# Altium footprint library VNGS01 V1.31.PcbLib: 36 footprints (part 2 of 3)
Each footprint in its own frame and in the unit in brackets; x right, y up, seen from the top. Pads: shape width x height; smd on the part's side, far side on the other; paste and mask are expansions set on the pad; w line width, h text height; cw(c..) or ccw(c..) is an arc to the next point about the centre after c.
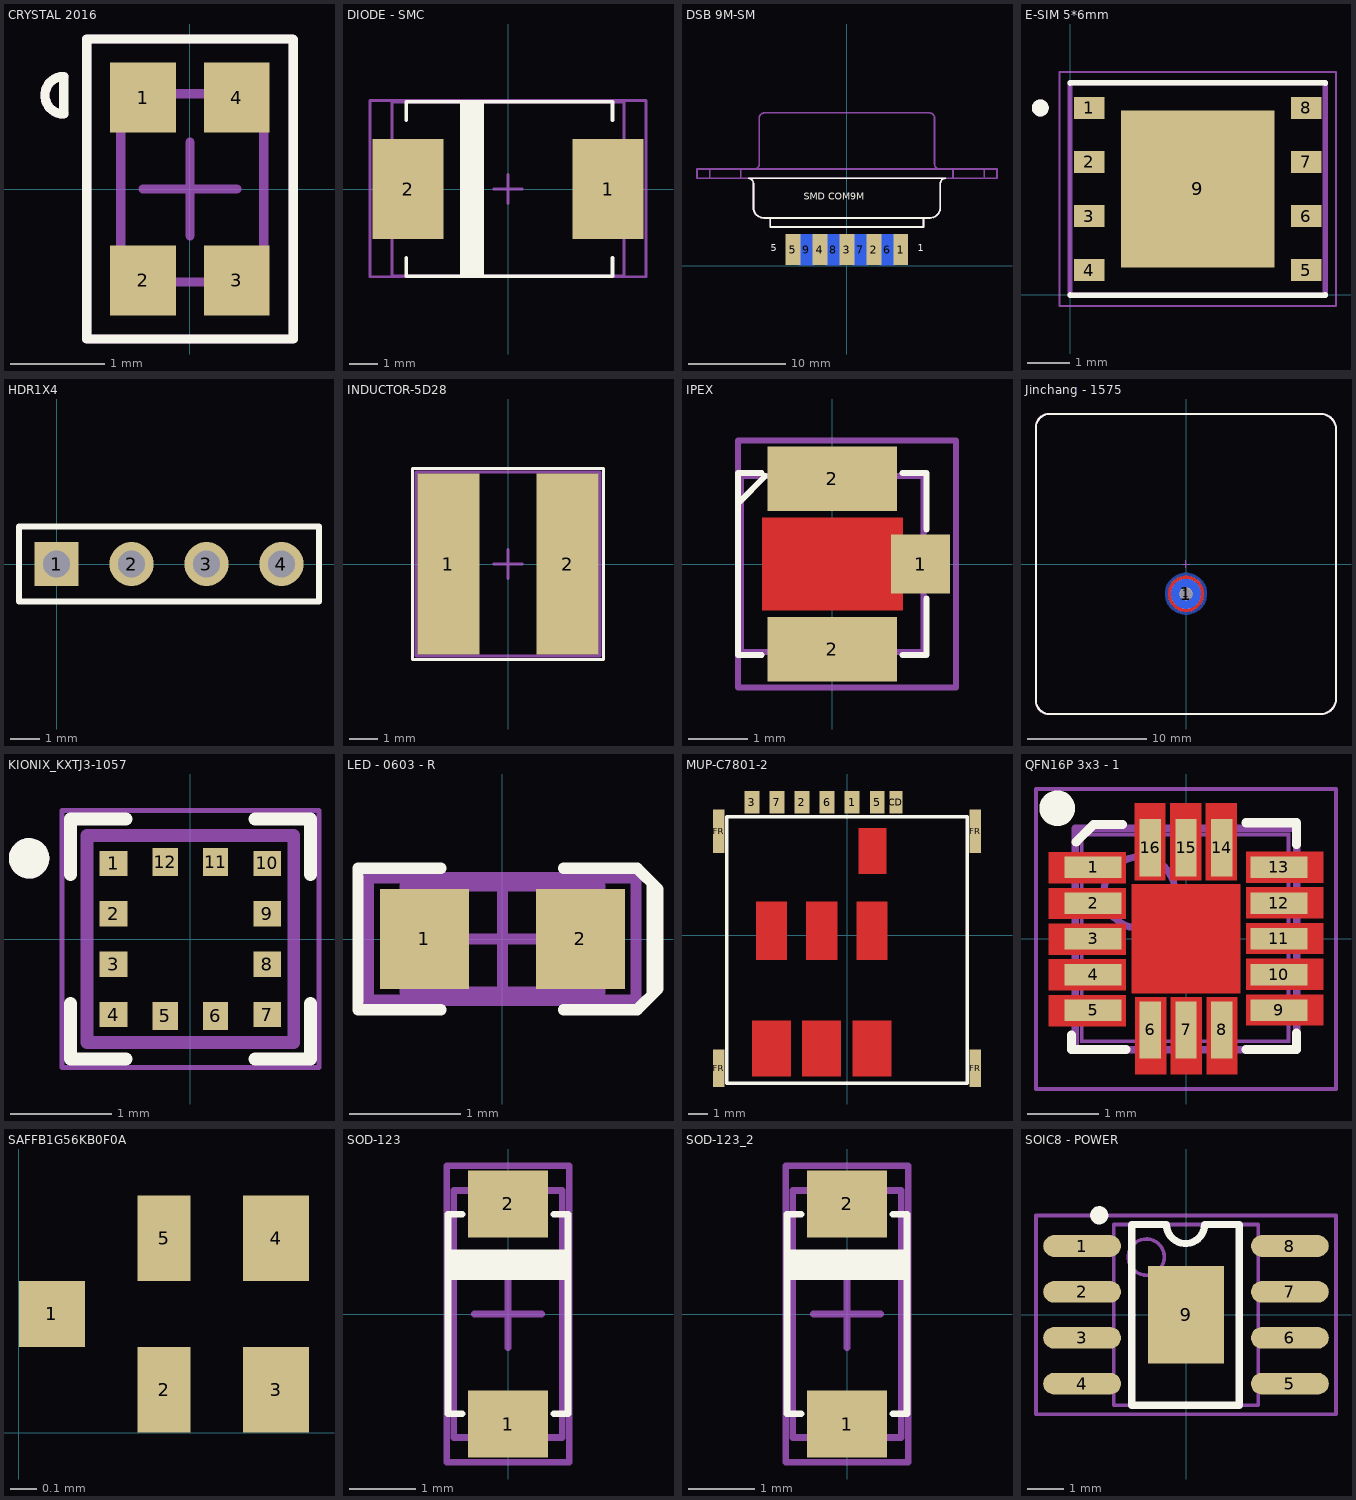
[diagram p1: the footprints below, top view; thin cyan lines are the x and y axes]

## CRYSTAL 2016 [mm] "Surface Mount,4-SMD, No Lead (DFN, LCC),2.00mm x 1.60mm"
height 0.7
pads (4):
  rect 0.7x0.75 smd mask+0.119: 1(-0.5,0.975) 2(-0.5,-0.975) 3(0.5,-0.975) 4(0.5,0.975)
Top Overlay:
  lines w0.1: -1.346,0.799 cw(c-1.346,0.999) -1.346,1.199 -1.346,0.799 ; -1.099,-1.599 1.099,-1.599 1.099,1.593 1.094,1.599 -1.099,1.599 -1.099,-1.599
Mechanical 1:
  lines w0.1: -1.346,0.799 cw(c-1.346,0.999) -1.346,1.199
Mechanical 13:
  lines w0.1: -0.737,-0.991 0.787,-0.991 0.787,1.016 -0.737,1.016 -0.737,-0.991
Mechanical 15:
  lines w0.1: -0.5,0 0.5,0 ; 0,-0.5 0,0.5 ; -1.099,-1.599 -1.099,1.599 1.094,1.599 1.099,1.593 1.099,-1.599 -1.099,-1.599
3D body "User Library-NT2016SA-END4910A-48MHZ Crystal (NDK).STEP": height 0.7, standoff 0, extent -0.771,-0.985 0.829,1.015

## DIODE - SMC [mm] "Diode; 2 Leads, 6.8x5.9mm"
pads (2):
  rect 2.5x3.5 smd: 1(3.5,0) 2(-3.5,0)
Top Overlay:
  rectangle: -1.676,-3.099 -0.838,3.048
  lines w0.127: -3.556,-2.413 -3.556,-3.048 3.658,-3.048 3.658,-2.413 ; -3.556,2.413 -3.556,3.048 3.658,3.048 3.658,2.413 ; -1.397,-3.048 -1.397,3.048
Mechanical 13:
  lines w0.1: -4.064,-3.048 -4.064,3.048 4.064,3.048 4.064,-3.048 -4.064,-3.048
Mechanical 15:
  lines w0.1: -0.5,0 0.5,0 ; 0,-0.5 0,0.5 ; -4.826,-3.073 -4.826,3.099 -4.724,3.099 4.826,3.099 4.826,-3.073 -4.826,-3.073
3D body "Diode - SMC.STEP": height 2.4, standoff 0.03, extent -4.065,-3.05 4.065,3.05

## DSB 9M-SM [mil] "Com 9 chan SMD,F"
height 296.46
pads (9):
  rect 60x125.98 smd: 1(218.11,66) 2(109.06,66) 3(0,66) 4(-109.06,66) 5(-218.11,66)
  rect 60x125.98 smd far side: 6(163.58,66) 7(54.53,66) 8(-54.53,66) 9(-163.58,66)
Top Overlay:
  lines w7: -377.95,236 -377.95,332.93 ; 377.95,236.95 377.95,334
  lines w7.01: -398.93,354.98 cw(c-399.46,333.46) -377.95,332.93 ; -395,354.98 400,354.98 ccw(c399.46,333.46) 377.95,334 ; -377.95,236 ccw(c-335.45,236.45) -335,193.95 335.95,193.95 ; -310,193.95 -310,157.73 310,157.73 ; 310,158 310,193 ; 335.95,194 ccw(c335.5,236.5) 378,236.95
  text "1" at 287,50 h47.24
  text "5" at -308,50 h47.24
  text "SMD COM9M" at -174.02,257.86 h47.24
Mechanical 13:
  lines w7: -377.95,236 -377.95,332.93 ; -333.07,619 333.07,619 ; 377.95,236.95 377.95,334
  lines w7.01: -554.92,354.98 -554.92,391.98 ; -428.94,357 -428.94,388 ; -398.93,354.98 cw(c-399.46,333.46) -377.95,332.93 ; -377.95,236 ccw(c-335.45,236.45) -335,193.95 335.95,193.95 ; -373.35,391.98 ccw(c-374.18,411.82) -354.35,412.65 -354.33,598.07 cw(c-333.24,597.91) -333.07,619 ; -310,193.95 -310,157.73 310,157.73 ; 310,158 310,193 ; 333.07,619 cw(c333.24,597.91) 354.33,598.07 354.33,411 ccw(c374.17,411.83) 375,392 ; 335.95,194 ccw(c335.5,236.5) 378,236.95 ; 377.95,334 cw(c399.46,333.46) 400,354.98 ; 428.94,358 428.94,389 ; 554.92,360 554.92,391 ; -606,355 -606,392 607,391.98 607,354.98 -325,354.98 -606,354.98
  text "SMD COM9M" at -174.02,257.86 h47.24
3D body "DB9 Straight.STEP": height 220.41, standoff -275.59, extent -606,20 607,619

## E-SIM 5*6mm [mm]
pads (9):
  rect 0.71x0.51 smd: 1(0.447,4.394) 2(0.447,3.124) 3(0.447,1.854) 4(0.447,0.584) 5(5.547,0.584) 6(5.547,1.854) 7(5.547,3.124) 8(5.547,4.394)
  rect 3.6x3.7 smd paste-3: 9(2.997,2.489)
Top Overlay:
  circle w0.2: c-0.703,4.394 r0.1
  lines w0.127: -0.003,0.009 -0.003,-0.011 5.997,-0.011 5.997,0.009 ; -0.003,4.969 -0.003,4.989 5.997,4.989 5.997,4.969
Top Paste:
  region: 4.352,1.084 3.222,1.084 3.222,2.264 4.352,2.264
  region: 2.772,2.714 1.642,2.714 1.642,3.894 2.772,3.894
  region: 2.772,1.084 1.642,1.084 1.642,2.264 2.772,2.264
  region: 4.352,2.714 3.222,2.714 3.222,3.894 4.352,3.894
Top Courtyard:
  lines w0.05: -0.253,-0.261 6.247,-0.261 6.247,5.239 -0.253,5.239 -0.253,-0.261
Top 3D Body:
  circle w0.2: c-0.703,4.394 r0.1
  lines w0.127: -0.003,-0.011 5.997,-0.011 5.997,4.989 -0.003,4.989 -0.003,-0.011
3D body "step_temp.STEP": height 0.82, standoff 0, extent -0.003,-0.011 5.997,4.989

## HDR1X4 [mm] "Connector; Header; 4 Position"
height 2.54
pads (4):
  rect 1.5x1.5 hole 0.9: 1(0,0)
  round 1.5 hole 0.9: 2(2.54,0) 3(5.08,0) 4(7.62,0)
Top Overlay:
  lines w0.2: -1.27,-1.27 -1.27,1.27 8.89,1.27 8.89,-1.27 -1.27,-1.27
3D body: height 7, standoff -1, extent 7.214,-0.406 8.011,0.392
3D body: height 1.5, standoff 0, extent 6.35,-1.27 8.89,1.27
3D body: height 1.5, standoff 0, extent -1.27,-1.27 1.27,1.27
3D body: height 1.5, standoff 0, extent 3.81,-1.27 6.35,1.27
3D body: height 1.5, standoff 0, extent 1.27,-1.27 3.81,1.27
3D body: height 7, standoff -1, extent -0.406,-0.406 0.39,0.392
3D body: height 7, standoff -1, extent 4.674,-0.406 5.47,0.392
3D body: height 7, standoff -1, extent 2.134,-0.406 2.93,0.392

## INDUCTOR-5D28 [mm] "Shielded Inductor 6x6mm"
pads (2):
  rect 2.15x6.3 smd: 1(-2.075,0) 2(2.075,0)
Top Overlay:
  lines w0.1: -3.327,-3.327 -3.327,3.327 -3.302,3.327 3.327,3.327 3.327,-3.327 -3.302,-3.327 -3.327,-3.327
Mechanical 13:
  lines w0.1: -3.2,-3.2 3.2,-3.2 3.2,3.2 -3.2,3.2 -3.2,-3.2
Mechanical 15:
  lines w0.1: -0.5,0 0.5,0 ; 0,-0.5 0,0.5 ; -3.327,-3.327 3.327,-3.327 3.327,3.327 -3.327,3.327 -3.327,-3.327
3D body "INDUCTOR 5D28.STEP": height 3, standoff 0, extent -3.104,-3 2.896,3

## IPEX [mm] "Connector SMA, 3mmx3.1mm, high 1.25mm."
height 7.53
pads (3):
  rect 1x1 smd: 1(1.5,0)
  rect 2.2x1.1 smd: 2(0,-1.45) 2(0,1.45)
Top Layer:
  pour cut-out: -1.194,0.787 -1.194,-0.787 1.194,-0.787 1.194,0.787
Top Overlay:
  lines w0.1: -1.599,1.035 -1.136,1.498 ; -1.2,-1.55 -1.6,-1.55 -1.6,1.55 -1.2,1.55 ; 1.194,-1.55 1.6,-1.55 1.6,-0.584 ; 1.194,1.55 1.6,1.55 1.6,0.584
Mechanical 13:
  lines w0.1: -1.549,-1.499 1.549,-1.499 1.549,1.499 -1.549,1.499 -1.549,-1.499
Mechanical 15:
  lines w0.1: -0.3,0 0.3,0 ; 0,-0.3 0,0.3 ; -1.6,-2.1 -1.6,2.1 2.1,2.1 2.1,-2.1 -1.6,-2.1
3D body "User Library-20279-001.STEP": height 1.25, standoff -0.01, extent -1.55,-1.5 1.55,1.5

## Jinchang - 1575 [mm] "Anten GPS, 25x25x4mm"
height 4
pads (2):
  round 1.1 hole 1: 1(0,-2.5)
  round 2.5 smd far side: 1(0,-2.5)
Top Layer:
  pour cut-out: -1.5,-2.5 -1.5,-2.648 -1.442,-2.938 -1.329,-3.211 -1.165,-3.456 -0.956,-3.665 -0.711,-3.829 -0.438,-3.942 -0.148,-4 0,-4 0.148,-4 0.438,-3.942 0.711,-3.829 0.956,-3.665 1.165,-3.456 1.329,-3.211 1.442,-2.938 1.5,-2.648 1.5,-2.5 1.5,-2.352 1.442,-2.062 1.329,-1.789 1.165,-1.544 0.956,-1.335 0.711,-1.171 0.438,-1.058 0.148,-1 0,-1 -0.148,-1 -0.438,-1.058 -0.711,-1.171 -0.956,-1.335 -1.165,-1.544 -1.329,-1.789 -1.442,-2.062 -1.5,-2.352
Bottom Layer:
  pour cut-out: -1.75,-2.5 -1.75,-2.672 -1.683,-3.01 -1.551,-3.329 -1.359,-3.616 -1.116,-3.859 -0.829,-4.051 -0.51,-4.183 -0.172,-4.25 0,-4.25 0.172,-4.25 0.51,-4.183 0.829,-4.051 1.116,-3.859 1.359,-3.616 1.551,-3.329 1.683,-3.01 1.75,-2.672 1.75,-2.5 1.75,-2.328 1.683,-1.99 1.551,-1.671 1.359,-1.384 1.116,-1.141 0.829,-0.949 0.51,-0.817 0.172,-0.75 0,-0.75 -0.172,-0.75 -0.51,-0.817 -0.829,-0.949 -1.116,-1.141 -1.359,-1.384 -1.551,-1.671 -1.683,-1.99 -1.75,-2.328
Top Overlay:
  lines w0.178: -12.55,-11.176 -12.55,11.43 ; -12.55,-10.668 -12.55,-11.43 ccw(c-11.43,-11.43) -11.43,-12.55 -10.16,-12.55 ; -12.55,11.176 -12.55,11.43 ; -11.303,-12.55 11.28,-12.55 ; -10.795,12.55 -11.43,12.55 ; 10.668,-12.55 11.28,-12.55 ; 12.55,-10.795 12.55,-11.28 ; -12.55,11.43 cw(c-11.43,11.43) -11.43,12.55 ; -11.43,12.55 10.795,12.55 11.28,12.55 cw(c11.28,11.28) 12.55,11.28 12.55,11.049 12.55,-11.28 ; 11.28,-12.55 ccw(c11.28,-11.28) 12.55,-11.28
Mechanical 13:
  lines w0.178: -12.55,-11.176 -12.55,11.43 ; -12.55,-10.668 -12.55,-11.43 ccw(c-11.43,-11.43) -11.43,-12.55 -10.16,-12.55 ; -12.55,11.176 -12.55,11.43 ; -11.303,-12.55 11.28,-12.55 ; -10.795,12.55 -11.43,12.55 ; 10.668,-12.55 11.28,-12.55 ; 12.55,-10.795 12.55,-11.28 ; -12.55,11.43 cw(c-11.43,11.43) -11.43,12.55 ; -11.43,12.55 10.795,12.55 11.28,12.55 cw(c11.28,11.28) 12.55,11.28 12.55,11.049 12.55,-11.28 ; 11.28,-12.55 ccw(c11.28,-11.28) 12.55,-11.28
Mechanical 15:
  lines w0.1: -0.3,0 0.3,0 ; 0,-0.3 0,0.3
  lines w0.178: -12.55,-11.176 -12.55,11.43 ; -12.55,-10.668 -12.55,-11.43 ccw(c-11.43,-11.43) -11.43,-12.55 -10.16,-12.55 ; -12.55,11.176 -12.55,11.43 ; -11.303,-12.55 11.28,-12.55 ; -10.795,12.55 -11.43,12.55 ; 10.668,-12.55 11.28,-12.55 ; 12.55,-10.795 12.55,-11.28 ; -12.55,11.43 cw(c-11.43,11.43) -11.43,12.55 ; -11.43,12.55 10.795,12.55 11.28,12.55 cw(c11.28,11.28) 12.55,11.28 12.55,11.049 12.55,-11.28 ; 11.28,-12.55 ccw(c11.28,-11.28) 12.55,-11.28
3D body "Anten GPS-1575.STEP": height 5, standoff -3, extent -12.554,-12.4 12.446,12.6

## KIONIX_KXTJ3-1057 [mm]
height 1.3
pads (12):
  rect 0.275x0.25 smd: 1(-0.763,0.75) 2(-0.763,0.25) 3(-0.763,-0.25) 4(-0.763,-0.75) 7(0.763,-0.75) 8(0.763,-0.25) 9(0.763,0.25) 10(0.763,0.75)
  rect 0.25x0.275 smd: 5(-0.25,-0.763) 6(0.25,-0.763) 11(0.25,0.763) 12(-0.25,0.763)
Top Overlay:
  circle w0.2: c-1.6,0.8 r0.1
  lines w0.127: -1.19,-0.64 -1.19,-1.19 -0.64,-1.19 ; -1.19,0.64 -1.19,1.19 -0.64,1.19 ; 0.64,-1.19 1.19,-1.19 1.19,-0.64 ; 0.64,1.19 1.19,1.19 1.19,0.64
Mechanical 13:
  circle w0.2: c-1.6,0.8 r0.1
  lines w0.127: -1.025,-1.025 1.025,-1.025 1.025,1.025 -1.025,1.025 -1.025,-1.025
Mechanical 15:
  lines w0.05: -1.275,-1.275 1.275,-1.275 1.275,1.275 -1.275,1.275 -1.275,-1.275

## LED - 0603 - R [mm] "Chip Capacitor, Body 1.6x0.8mm, IPC High Density"
height 1.3
pads (2):
  rect 0.8x0.9 smd: 1(-0.7,0) 2(0.7,0)
Top Overlay:
  rectangle: 1.295,-0.499 1.397,0.508
  lines w0.1: -0.55,-0.635 -1.295,-0.635 -1.295,0.635 -0.55,0.635 ; 0.55,-0.635 1.092,-0.635 1.21,-0.635 1.397,-0.448 1.397,0.448 1.21,0.635 1.092,0.635 0.55,0.635
Mechanical 13:
  lines w0.1: -0.875,-0.475 -0.875,0.475 0.875,0.475 0.875,-0.475 -0.875,-0.475
Mechanical 15:
  lines w0.1: -0.475,0 0.475,0 ; 0,-0.475 0,0.475 ; -1.2,-0.55 -1.2,0.55 1.2,0.55 1.2,-0.55 -1.2,-0.55
3D body "LED_0603_R.STEP": height 0.6, standoff 0, extent -0.8,-0.4 0.8,0.4

## MUP-C7801-2 [mm]
height 1.035
pads (11):
  rect 0.75x1.13 smd: 1(0.26,6.743) 2(-2.28,6.743) 3(-4.82,6.743) 5(1.53,6.743) 6(-1.01,6.743) 7(-3.55,6.743)
  rect 0.65x1.13 smd: CD(2.48,6.743)
  rect 0.58x1.9 smd: FR(-6.5,-6.742) FR(6.5,-6.742)
  rect 0.58x2.2 smd: FR(-6.5,5.258) FR(6.5,5.258)
Top Layer:
  pour cut-out: 0.285,-7.143 2.235,-7.143 2.235,-4.343 0.285,-4.343
  pour cut-out: -2.255,-7.143 -0.305,-7.143 -0.305,-4.343 -2.255,-4.343
  pour cut-out: 0.485,-1.242 2.035,-1.242 2.035,1.707 0.485,1.707
  pour cut-out: -2.055,-1.242 -2.055,1.707 -0.505,1.707 -0.505,-1.242
  pour cut-out: -4.595,-1.242 -3.045,-1.242 -3.045,1.707 -4.595,1.707
  pour cut-out: -4.795,-4.343 -2.845,-4.343 -2.845,-7.143 -4.795,-7.143
  pour cut-out: 0.6,3.107 2,3.107 2,5.407 0.6,5.407
Top Overlay:
  lines w0.178: -6.1,-7.492 6.1,-7.492 6.1,6.008 -6.1,6.008 -6.1,-7.492

## QFN16P 3x3 - 1 [mm] "QFN, 16-Leads, Body 3.00x3.00mm, Pitch 0.50mm, IPC Medium Density"
height 1
pads (16):
  rect 0.8x0.3 smd paste-0.015: 1(-1.3,1) 2(-1.3,0.5) 3(-1.3,0) 4(-1.3,-0.5) 5(-1.3,-1) 9(1.3,-1) 10(1.3,-0.5) 11(1.3,0) 12(1.3,0.5) 13(1.3,1)
  rect 0.3x0.8 smd paste-0.015: 6(-0.5,-1.275) 7(0,-1.275) 8(0.5,-1.275) 14(0.5,1.275) 15(0,1.275) 16(-0.5,1.275)
Top Layer:
  pour cut-out: -0.762,-0.762 -0.762,0.762 0.762,0.762 0.762,-0.762
  pour cut-out: -0.843,0.779 -1.923,0.779 -1.923,1.212 -0.843,1.212
  pour cut-out: -0.843,0.28 -1.923,0.28 -1.923,0.712 -0.843,0.712
  pour cut-out: -0.843,-0.221 -1.923,-0.221 -1.923,0.212 -0.843,0.212
  pour cut-out: -0.843,-0.721 -1.923,-0.721 -1.923,-0.289 -0.843,-0.289
  pour cut-out: -0.843,-1.221 -1.923,-1.221 -1.923,-0.788 -0.843,-0.788
  pour cut-out: -0.28,-0.818 -0.28,-1.897 -0.712,-1.897 -0.712,-0.818
  pour cut-out: 0.221,-0.818 0.221,-1.897 -0.212,-1.897 -0.212,-0.818
  pour cut-out: 0.721,-0.818 0.721,-1.897 0.289,-1.897 0.289,-0.818
  pour cut-out: 0.843,-0.779 1.923,-0.779 1.923,-1.212 0.843,-1.212
  pour cut-out: 0.843,-0.28 1.923,-0.28 1.923,-0.712 0.843,-0.712
  pour cut-out: 0.843,0.221 1.923,0.221 1.923,-0.212 0.843,-0.212
  pour cut-out: 0.843,0.721 1.923,0.721 1.923,0.289 0.843,0.289
  pour cut-out: 0.843,1.221 1.923,1.221 1.923,0.788 0.843,0.788
  pour cut-out: 0.28,0.818 0.28,1.897 0.712,1.897 0.712,0.818
  pour cut-out: -0.221,0.818 -0.221,1.897 0.212,1.897 0.212,0.818
  pour cut-out: -0.721,0.818 -0.721,1.897 -0.289,1.897 -0.289,0.818
Top Overlay:
  circle w0.25: c-1.803,1.829 r0.125
  lines w0.127: -1.6,-1.346 -1.6,-1.549 -0.838,-1.549 ; -1.537,1.359 -1.295,1.6 -0.889,1.6 ; 0.838,-1.549 1.549,-1.549 1.549,-1.321 ; 0.838,1.626 1.549,1.626 1.549,1.321
Mechanical 13:
  circle w0.1: c-0.65,0.648 r0.5
  lines w0.1: -1.55,-1.552 -1.55,1.548 1.55,1.548 1.55,-1.552 -1.55,-1.552
Mechanical 15:
  lines w0.05: -2.1,-2.102 -2.1,2.098 2.1,2.098 2.1,-2.102 -2.1,-2.102
  lines w0.1: -0.5,-0.002 0.5,-0.002 ; 0,-0.502 0,0.498
Mechanical59:
  drawing of 431 lines, arcs and shapes, not listed
3D body "QFN50P300X300X50-16N.step": height 0.5, standoff 0, extent -1.56,-1.56 1.56,1.56

## SAFFB1G56KB0F0A [mm] "SAW Filter RF 1561.1MHz/1575.42MHz/1602MHz 1.9dB 50Ohm SMD 5 Pin Ammo"
height 0.9
pads (5):
  rect 0.25x0.25 smd paste+0 mask+0.102: 1(0.125,0.45)
  rect 0.2x0.325 smd paste+0 mask+0.102: 2(0.55,0.162) 5(0.55,0.737)
  rect 0.25x0.325 smd paste+0 mask+0.102: 3(0.975,0.162) 4(0.975,0.737)
3D body: height 0.2, standoff 0, extent 0.125,0.162 0.975,0.737

## SOD-123 [mm] "SOD123, 2-Leads, Body 2.6x1.6mm, Pitch 3.05mm, IPC High Density"
height 1.8
pads (2):
  rect 1.2x1 smd: 1(0,-1.652) 2(0,1.652)
Top Overlay:
  rectangle: -0.889,0.508 0.864,0.966
  lines w0.1: -0.687,-1.5 -0.9,-1.5 -0.9,1.5 -0.687,1.5 ; 0.687,-1.5 0.9,-1.5 0.9,1.5 0.687,1.5
Top Courtyard:
  lines w0.1: -0.508,0 0.508,0 ; 0,-0.508 0,0.508 ; 0.914,2.228 -0.92,2.228 -0.92,-2.228 0.92,-2.228 0.92,2.228
Top 3D Body:
  lines w0.1: -0.813,-1.854 -0.813,1.854 0.813,1.854 0.813,-1.854 -0.813,-1.854
3D body "SOD123.STEP": height 1.27, standoff 0, extent -0.8,-1.85 0.8,1.85

## SOD-123_2 [mm]
pads (2):
  rect 1.2x1 smd: 1(0,-1.652) 2(0,1.652)
Top Overlay:
  rectangle: -0.889,0.508 0.864,0.965
  lines w0.1: -0.687,-1.5 -0.9,-1.5 -0.9,1.5 -0.687,1.5 ; 0.687,-1.5 0.9,-1.5 0.9,1.5 0.687,1.5
Mechanical 13:
  lines w0.1: -0.813,-1.854 0.813,-1.854 0.813,1.854 -0.813,1.854 -0.813,-1.854
Mechanical 15:
  lines w0.1: -0.508,0 0.508,0 ; 0,-0.508 0,0.508 ; 0.914,2.228 -0.92,2.228 -0.92,-2.228 0.92,-2.228 0.92,2.228
3D body "SOD123.STEP": height 1.27, standoff 0, extent -0.8,-1.85 0.8,1.85

## SOIC8 - POWER [mm] "SOIC, 8-Leads, Body 4.9x3.9mm, Pitch 1.27mm, IPC Medium Density"
height 1.75
pads (9):
  oval 2.15x0.6 smd: 1(-2.875,1.905) 2(-2.875,0.635) 3(-2.875,-0.635) 4(-2.875,-1.905) 5(2.875,-1.905) 6(2.875,-0.635) 7(2.875,0.635) 8(2.875,1.905)
  rect 2.1x2.7 smd: 9(0,0)
Top Overlay:
  circle w0.25: c-2.4,2.755 r0.125
  lines w0.2: -1.5,-2.5 -1.5,2.5 -0.54,2.5 ccw(c-0.012,2.5) 0.515,2.5 1.475,2.5 1.475,-2.5 -1.5,-2.5
Mechanical 13:
  circle w0.1: c-1.1,1.6 r0.5
  lines w0.1: -2,-2.5 -2,2.5 2,2.5 2,-2.5 -2,-2.5
Mechanical 15:
  lines w0.1: -0.5,0 0.5,0 ; 0,-0.5 0,0.5 ; -4.15,-2.75 -4.15,2.75 4.15,2.75 4.15,-2.75 -4.15,-2.75
3D body "User Library-SOIC-8-1.STEP": height 1.75, standoff 0, extent -3,-2.45 3,2.45